# Altium schematic symbol library Connector.SchLib: 372 symbols (part 3 of 4)
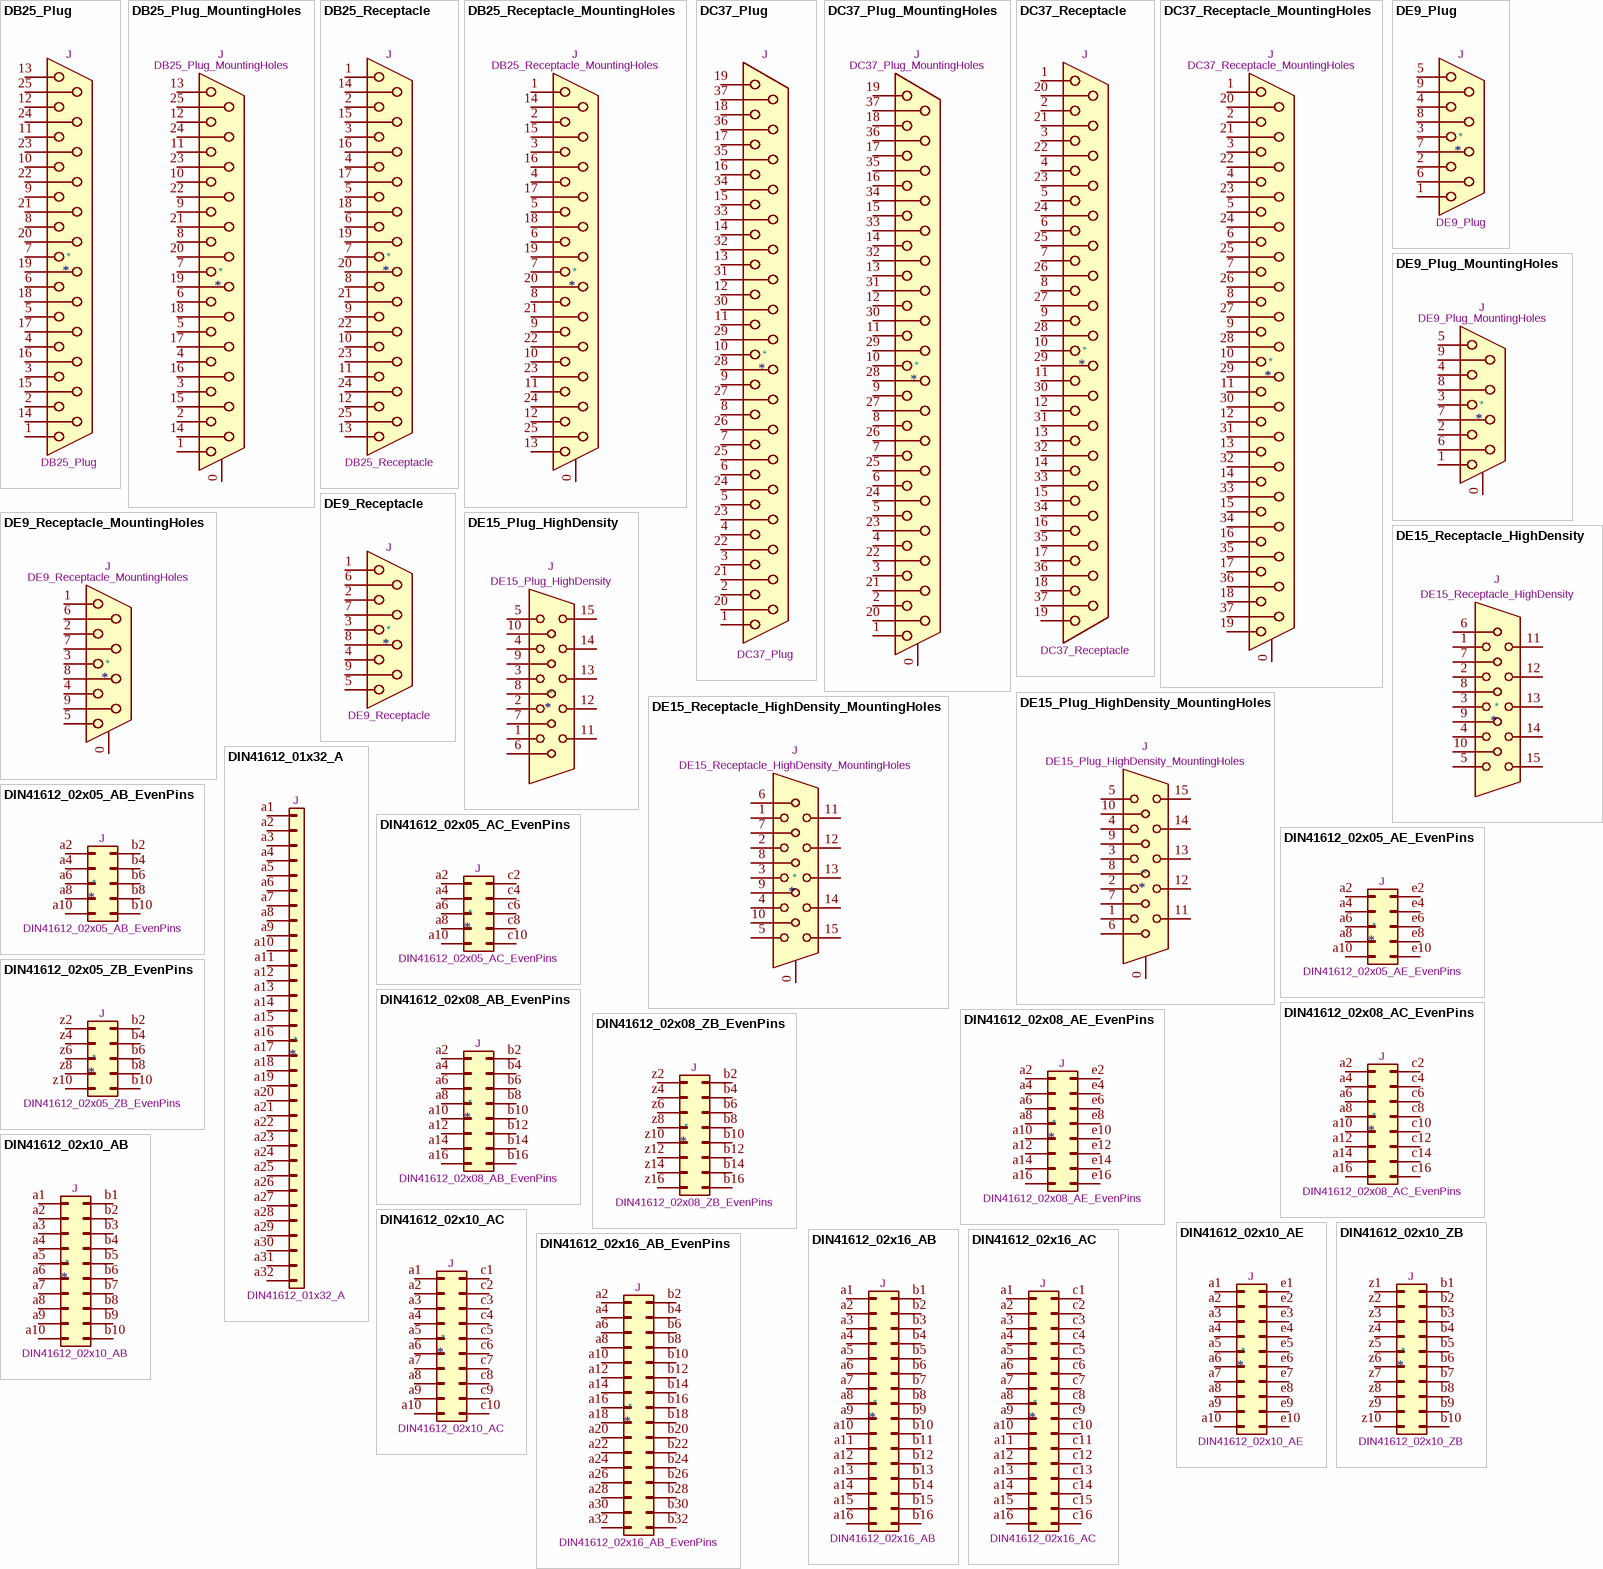
[diagram p18: symbols DB25_Plug to DIN41612_02x16_AC]

## DE15_Receptacle_HighDensity_MountingHoles
designator *  value DE15_Receptacle_HighDensity_MountingHoles  Reference: J
ki_keywords: connector receptacle de15 female D-SUB VGA; ki_description: 15-pin female receptacle socket D-SUB connector, High density (3 columns), Triple Row, Generic, VGA-connector, Mounting Hole; ki_fp_filters: DSUB*Female*; Datasheet: ~
pins: 0, 1, 2, 3, 4, 5, 6, 7, 8, 9, 10, 11, 12, 13, 14, 15

## DIN41612_01x32_A
designator *  value DIN41612_01x32_A  Reference: J
ki_keywords: connector; ki_description: DIN41612 connector, single row (A), 01x32, script generated (kicad-library-utils/schlib/autogen/connector/); ki_fp_filters: DIN41612*1x*; Datasheet: ~
pins: a1 Pin_a1, a2 Pin_a2, a3 Pin_a3, a4 Pin_a4, a5 Pin_a5, a6 Pin_a6, a7 Pin_a7, a8 Pin_a8, a9 Pin_a9, a10 Pin_a10, a11 Pin_a11, a12 Pin_a12, a13 Pin_a13, a14 Pin_a14, a15 Pin_a15, a16 Pin_a16, a17 Pin_a17, a18 Pin_a18, a19 Pin_a19, a20 Pin_a20, a21 Pin_a21, a22 Pin_a22, a23 Pin_a23, a24 Pin_a24, a25 Pin_a25, a26 Pin_a26, a27 Pin_a27, a28 Pin_a28, a29 Pin_a29, a30 Pin_a30, a31 Pin_a31, a32 Pin_a32

## DIN41612_02x05_AB_EvenPins
designator *  value DIN41612_02x05_AB_EvenPins  Reference: J
ki_keywords: connector; ki_description: DIN41612 connector, double row (AB) even pins only, 02x05, script generated (kicad-library-utils/schlib/autogen/connector/); ki_fp_filters: DIN41612*2x*; Datasheet: ~
pins: a2 Pin_a2, a4 Pin_a4, a6 Pin_a6, a8 Pin_a8, a10 Pin_a10, b2 Pin_b2, b4 Pin_b4, b6 Pin_b6, b8 Pin_b8, b10 Pin_b10

## DIN41612_02x05_AC_EvenPins
designator *  value DIN41612_02x05_AC_EvenPins  Reference: J
ki_keywords: connector; ki_description: DIN41612 connector, double row (AC) even pins only, 02x05, script generated (kicad-library-utils/schlib/autogen/connector/); ki_fp_filters: DIN41612*2x*; Datasheet: ~
pins: a2 Pin_a2, a4 Pin_a4, a6 Pin_a6, a8 Pin_a8, a10 Pin_a10, c2 Pin_c2, c4 Pin_c4, c6 Pin_c6, c8 Pin_c8, c10 Pin_c10

## DIN41612_02x05_AE_EvenPins
designator *  value DIN41612_02x05_AE_EvenPins  Reference: J
ki_keywords: connector; ki_description: DIN41612 connector, double row (AE) even pins only, 02x05, script generated (kicad-library-utils/schlib/autogen/connector/); ki_fp_filters: DIN41612*2x*; Datasheet: ~
pins: a2 Pin_a2, a4 Pin_a4, a6 Pin_a6, a8 Pin_a8, a10 Pin_a10, e2 Pin_e2, e4 Pin_e4, e6 Pin_e6, e8 Pin_e8, e10 Pin_e10

## DIN41612_02x05_ZB_EvenPins
designator *  value DIN41612_02x05_ZB_EvenPins  Reference: J
ki_keywords: connector; ki_description: DIN41612 connector, double row (ZB) even pins only, 02x05, script generated (kicad-library-utils/schlib/autogen/connector/); ki_fp_filters: DIN41612*2x*; Datasheet: ~
pins: b2 Pin_b2, b4 Pin_b4, b6 Pin_b6, b8 Pin_b8, b10 Pin_b10, z2 Pin_z2, z4 Pin_z4, z6 Pin_z6, z8 Pin_z8, z10 Pin_z10

## DIN41612_02x08_AB_EvenPins
designator *  value DIN41612_02x08_AB_EvenPins  Reference: J
ki_keywords: connector; ki_description: DIN41612 connector, double row (AB) even pins only, 02x08, script generated (kicad-library-utils/schlib/autogen/connector/); ki_fp_filters: DIN41612*2x*; Datasheet: ~
pins: a2 Pin_a2, a4 Pin_a4, a6 Pin_a6, a8 Pin_a8, a10 Pin_a10, a12 Pin_a12, a14 Pin_a14, a16 Pin_a16, b2 Pin_b2, b4 Pin_b4, b6 Pin_b6, b8 Pin_b8, b10 Pin_b10, b12 Pin_b12, b14 Pin_b14, b16 Pin_b16

## DIN41612_02x08_AC_EvenPins
designator *  value DIN41612_02x08_AC_EvenPins  Reference: J
ki_keywords: connector; ki_description: DIN41612 connector, double row (AC) even pins only, 02x08, script generated (kicad-library-utils/schlib/autogen/connector/); ki_fp_filters: DIN41612*2x*; Datasheet: ~
pins: a2 Pin_a2, a4 Pin_a4, a6 Pin_a6, a8 Pin_a8, a10 Pin_a10, a12 Pin_a12, a14 Pin_a14, a16 Pin_a16, c2 Pin_c2, c4 Pin_c4, c6 Pin_c6, c8 Pin_c8, c10 Pin_c10, c12 Pin_c12, c14 Pin_c14, c16 Pin_c16

## DIN41612_02x08_AE_EvenPins
designator *  value DIN41612_02x08_AE_EvenPins  Reference: J
ki_keywords: connector; ki_description: DIN41612 connector, double row (AE) even pins only, 02x08, script generated (kicad-library-utils/schlib/autogen/connector/); ki_fp_filters: DIN41612*2x*; Datasheet: ~
pins: a2 Pin_a2, a4 Pin_a4, a6 Pin_a6, a8 Pin_a8, a10 Pin_a10, a12 Pin_a12, a14 Pin_a14, a16 Pin_a16, e2 Pin_e2, e4 Pin_e4, e6 Pin_e6, e8 Pin_e8, e10 Pin_e10, e12 Pin_e12, e14 Pin_e14, e16 Pin_e16

## DIN41612_02x08_ZB_EvenPins
designator *  value DIN41612_02x08_ZB_EvenPins  Reference: J
ki_keywords: connector; ki_description: DIN41612 connector, double row (ZB) even pins only, 02x08, script generated (kicad-library-utils/schlib/autogen/connector/); ki_fp_filters: DIN41612*2x*; Datasheet: ~
pins: b2 Pin_b2, b4 Pin_b4, b6 Pin_b6, b8 Pin_b8, b10 Pin_b10, b12 Pin_b12, b14 Pin_b14, b16 Pin_b16, z2 Pin_z2, z4 Pin_z4, z6 Pin_z6, z8 Pin_z8, z10 Pin_z10, z12 Pin_z12, z14 Pin_z14, z16 Pin_z16

## DIN41612_02x10_AB
designator *  value DIN41612_02x10_AB  Reference: J
ki_keywords: connector; ki_description: DIN41612 connector, double row (AB), 02x10, script generated (kicad-library-utils/schlib/autogen/connector/); ki_fp_filters: DIN41612*2x*; Datasheet: ~
pins: a1 Pin_a1, a2 Pin_a2, a3 Pin_a3, a4 Pin_a4, a5 Pin_a5, a6 Pin_a6, a7 Pin_a7, a8 Pin_a8, a9 Pin_a9, a10 Pin_a10, b1 Pin_b1, b2 Pin_b2, b3 Pin_b3, b4 Pin_b4, b5 Pin_b5, b6 Pin_b6, b7 Pin_b7, b8 Pin_b8, b9 Pin_b9, b10 Pin_b10

## DIN41612_02x10_AC
designator *  value DIN41612_02x10_AC  Reference: J
ki_keywords: connector; ki_description: DIN41612 connector, double row (AC), 02x10, script generated (kicad-library-utils/schlib/autogen/connector/); ki_fp_filters: DIN41612*2x*; Datasheet: ~
pins: a1 Pin_a1, a2 Pin_a2, a3 Pin_a3, a4 Pin_a4, a5 Pin_a5, a6 Pin_a6, a7 Pin_a7, a8 Pin_a8, a9 Pin_a9, a10 Pin_a10, c1 Pin_c1, c2 Pin_c2, c3 Pin_c3, c4 Pin_c4, c5 Pin_c5, c6 Pin_c6, c7 Pin_c7, c8 Pin_c8, c9 Pin_c9, c10 Pin_c10

## DIN41612_02x10_AE
designator *  value DIN41612_02x10_AE  Reference: J
ki_keywords: connector; ki_description: DIN41612 connector, double row (AE), 02x10, script generated (kicad-library-utils/schlib/autogen/connector/); ki_fp_filters: DIN41612*2x*; Datasheet: ~
pins: a1 Pin_a1, a2 Pin_a2, a3 Pin_a3, a4 Pin_a4, a5 Pin_a5, a6 Pin_a6, a7 Pin_a7, a8 Pin_a8, a9 Pin_a9, a10 Pin_a10, e1 Pin_e1, e2 Pin_e2, e3 Pin_e3, e4 Pin_e4, e5 Pin_e5, e6 Pin_e6, e7 Pin_e7, e8 Pin_e8, e9 Pin_e9, e10 Pin_e10

## DIN41612_02x10_ZB
designator *  value DIN41612_02x10_ZB  Reference: J
ki_keywords: connector; ki_description: DIN41612 connector, double row (ZB), 02x10, script generated (kicad-library-utils/schlib/autogen/connector/); ki_fp_filters: DIN41612*2x*; Datasheet: ~
pins: b1 Pin_b1, b2 Pin_b2, b3 Pin_b3, b4 Pin_b4, b5 Pin_b5, b6 Pin_b6, b7 Pin_b7, b8 Pin_b8, b9 Pin_b9, b10 Pin_b10, z1 Pin_z1, z2 Pin_z2, z3 Pin_z3, z4 Pin_z4, z5 Pin_z5, z6 Pin_z6, z7 Pin_z7, z8 Pin_z8, z9 Pin_z9, z10 Pin_z10

## DIN41612_02x16_AB
designator *  value DIN41612_02x16_AB  Reference: J
ki_keywords: connector; ki_description: DIN41612 connector, double row (AB), 02x16, script generated (kicad-library-utils/schlib/autogen/connector/); ki_fp_filters: DIN41612*2x*; Datasheet: ~
pins: a1 Pin_a1, a2 Pin_a2, a3 Pin_a3, a4 Pin_a4, a5 Pin_a5, a6 Pin_a6, a7 Pin_a7, a8 Pin_a8, a9 Pin_a9, a10 Pin_a10, a11 Pin_a11, a12 Pin_a12, a13 Pin_a13, a14 Pin_a14, a15 Pin_a15, a16 Pin_a16, b1 Pin_b1, b2 Pin_b2, b3 Pin_b3, b4 Pin_b4, b5 Pin_b5, b6 Pin_b6, b7 Pin_b7, b8 Pin_b8, b9 Pin_b9, b10 Pin_b10, b11 Pin_b11, b12 Pin_b12, b13 Pin_b13, b14 Pin_b14, b15 Pin_b15, b16 Pin_b16

## DIN41612_02x16_AB_EvenPins
designator *  value DIN41612_02x16_AB_EvenPins  Reference: J
ki_keywords: connector; ki_description: DIN41612 connector, double row (AB) even pins only, 02x16, script generated (kicad-library-utils/schlib/autogen/connector/); ki_fp_filters: DIN41612*2x*; Datasheet: ~
pins: a2 Pin_a2, a4 Pin_a4, a6 Pin_a6, a8 Pin_a8, a10 Pin_a10, a12 Pin_a12, a14 Pin_a14, a16 Pin_a16, a18 Pin_a18, a20 Pin_a20, a22 Pin_a22, a24 Pin_a24, a26 Pin_a26, a28 Pin_a28, a30 Pin_a30, a32 Pin_a32, b2 Pin_b2, b4 Pin_b4, b6 Pin_b6, b8 Pin_b8, b10 Pin_b10, b12 Pin_b12, b14 Pin_b14, b16 Pin_b16, b18 Pin_b18, b20 Pin_b20, b22 Pin_b22, b24 Pin_b24, b26 Pin_b26, b28 Pin_b28, b30 Pin_b30, b32 Pin_b32

## DIN41612_02x16_AC
designator *  value DIN41612_02x16_AC  Reference: J
ki_keywords: connector; ki_description: DIN41612 connector, double row (AC), 02x16, script generated (kicad-library-utils/schlib/autogen/connector/); ki_fp_filters: DIN41612*2x*; Datasheet: ~
pins: a1 Pin_a1, a2 Pin_a2, a3 Pin_a3, a4 Pin_a4, a5 Pin_a5, a6 Pin_a6, a7 Pin_a7, a8 Pin_a8, a9 Pin_a9, a10 Pin_a10, a11 Pin_a11, a12 Pin_a12, a13 Pin_a13, a14 Pin_a14, a15 Pin_a15, a16 Pin_a16, c1 Pin_c1, c2 Pin_c2, c3 Pin_c3, c4 Pin_c4, c5 Pin_c5, c6 Pin_c6, c7 Pin_c7, c8 Pin_c8, c9 Pin_c9, c10 Pin_c10, c11 Pin_c11, c12 Pin_c12, c13 Pin_c13, c14 Pin_c14, c15 Pin_c15, c16 Pin_c16

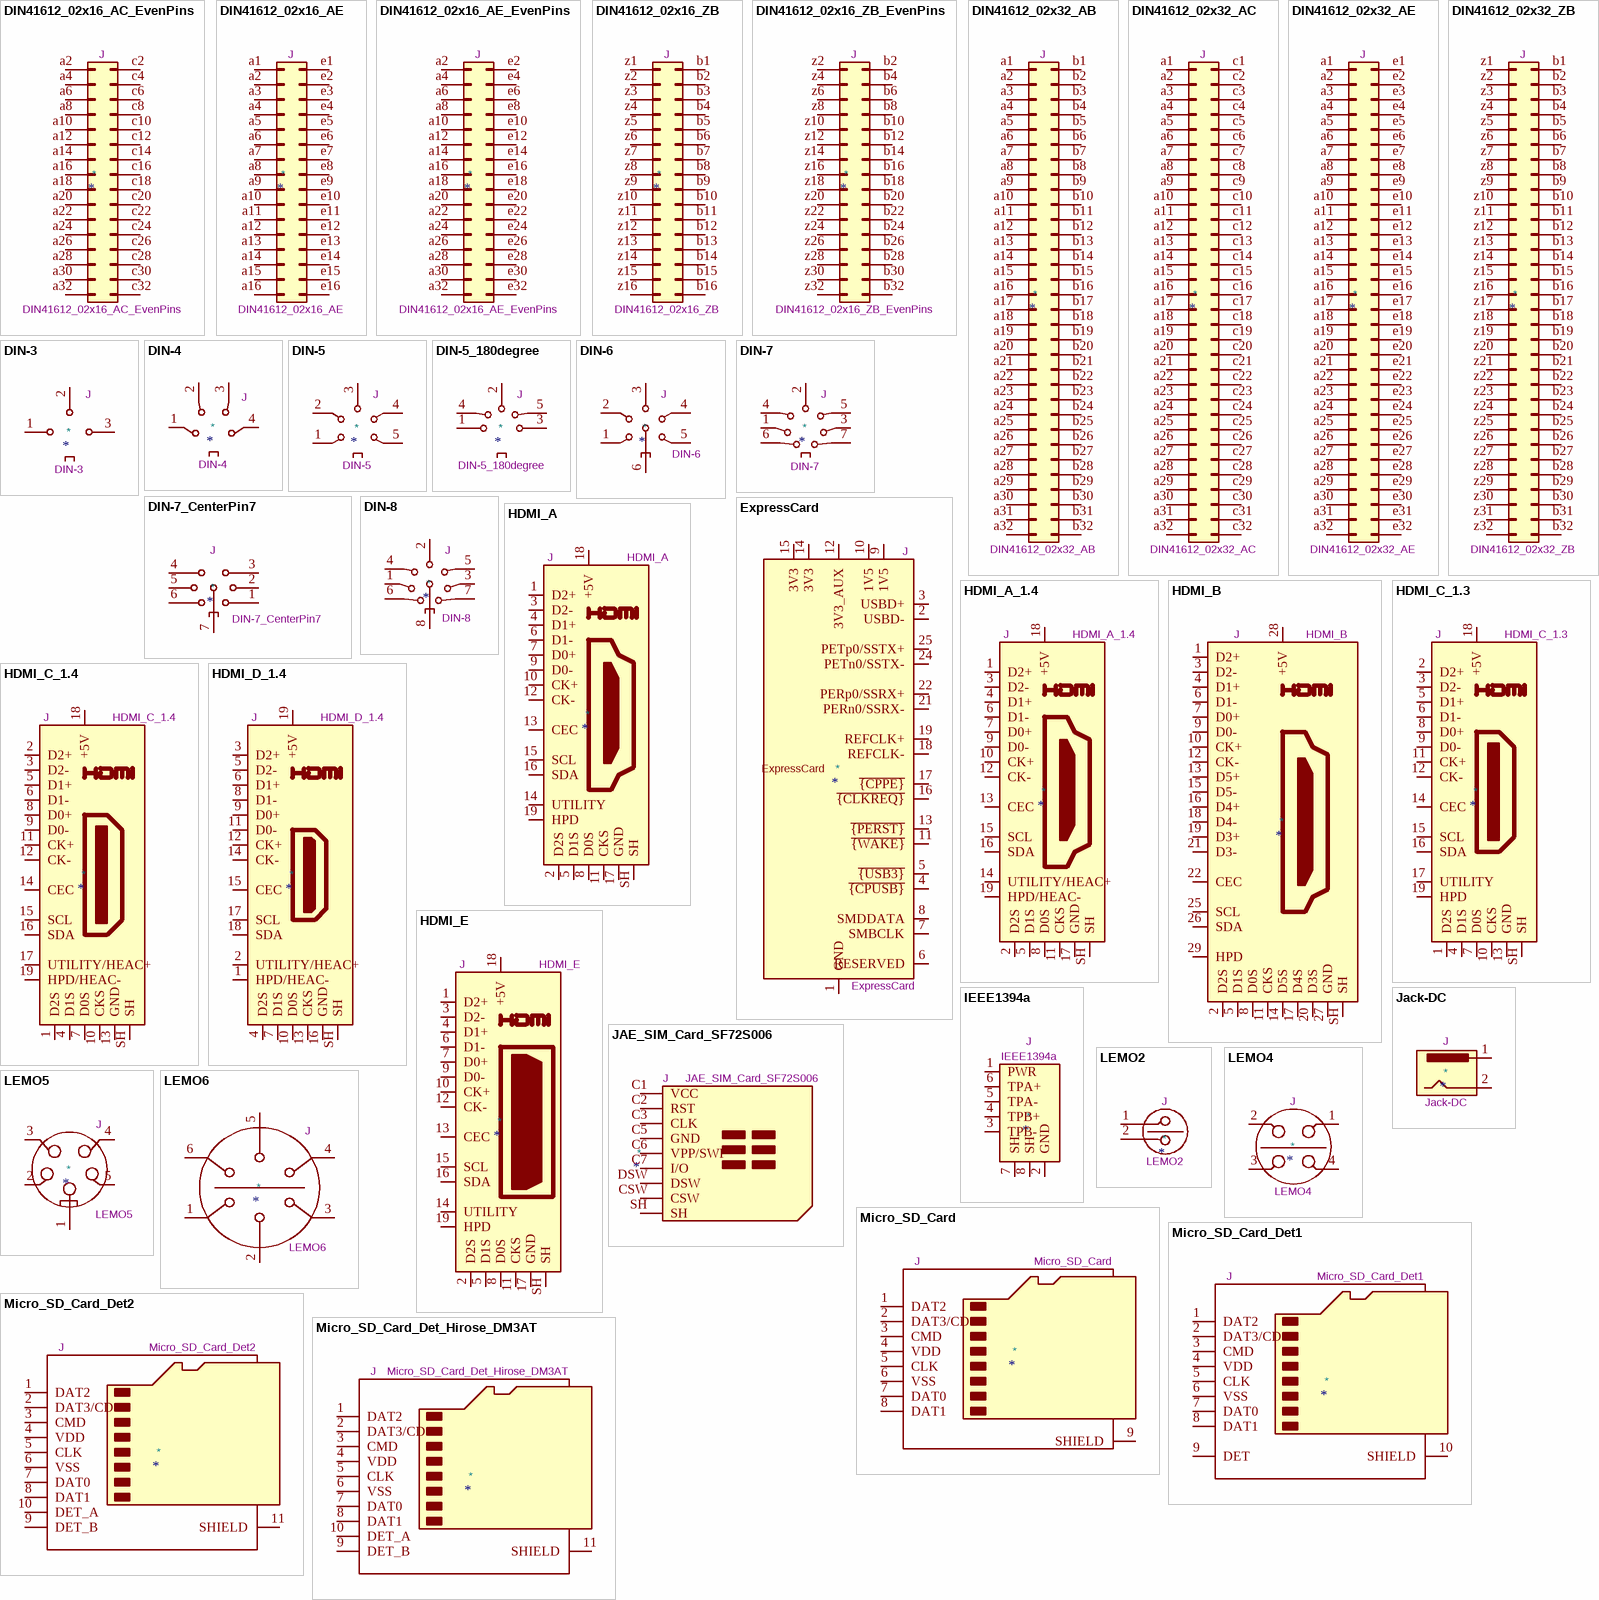
[diagram p10: symbols DIN41612_02x16_AC_EvenPins to Micro_SD_Card_Det_Hirose_DM3AT]

## DIN41612_02x16_AC_EvenPins
designator *  value DIN41612_02x16_AC_EvenPins  Reference: J
ki_keywords: connector; ki_description: DIN41612 connector, double row (AC) even pins only, 02x16, script generated (kicad-library-utils/schlib/autogen/connector/); ki_fp_filters: DIN41612*2x*; Datasheet: ~
pins: a2 Pin_a2, a4 Pin_a4, a6 Pin_a6, a8 Pin_a8, a10 Pin_a10, a12 Pin_a12, a14 Pin_a14, a16 Pin_a16, a18 Pin_a18, a20 Pin_a20, a22 Pin_a22, a24 Pin_a24, a26 Pin_a26, a28 Pin_a28, a30 Pin_a30, a32 Pin_a32, c2 Pin_c2, c4 Pin_c4, c6 Pin_c6, c8 Pin_c8, c10 Pin_c10, c12 Pin_c12, c14 Pin_c14, c16 Pin_c16, c18 Pin_c18, c20 Pin_c20, c22 Pin_c22, c24 Pin_c24, c26 Pin_c26, c28 Pin_c28, c30 Pin_c30, c32 Pin_c32

## DIN41612_02x16_AE
designator *  value DIN41612_02x16_AE  Reference: J
ki_keywords: connector; ki_description: DIN41612 connector, double row (AE), 02x16, script generated (kicad-library-utils/schlib/autogen/connector/); ki_fp_filters: DIN41612*2x*; Datasheet: ~
pins: a1 Pin_a1, a2 Pin_a2, a3 Pin_a3, a4 Pin_a4, a5 Pin_a5, a6 Pin_a6, a7 Pin_a7, a8 Pin_a8, a9 Pin_a9, a10 Pin_a10, a11 Pin_a11, a12 Pin_a12, a13 Pin_a13, a14 Pin_a14, a15 Pin_a15, a16 Pin_a16, e1 Pin_e1, e2 Pin_e2, e3 Pin_e3, e4 Pin_e4, e5 Pin_e5, e6 Pin_e6, e7 Pin_e7, e8 Pin_e8, e9 Pin_e9, e10 Pin_e10, e11 Pin_e11, e12 Pin_e12, e13 Pin_e13, e14 Pin_e14, e15 Pin_e15, e16 Pin_e16

## DIN41612_02x16_AE_EvenPins
designator *  value DIN41612_02x16_AE_EvenPins  Reference: J
ki_keywords: connector; ki_description: DIN41612 connector, double row (AE) even pins only, 02x16, script generated (kicad-library-utils/schlib/autogen/connector/); ki_fp_filters: DIN41612*2x*; Datasheet: ~
pins: a2 Pin_a2, a4 Pin_a4, a6 Pin_a6, a8 Pin_a8, a10 Pin_a10, a12 Pin_a12, a14 Pin_a14, a16 Pin_a16, a18 Pin_a18, a20 Pin_a20, a22 Pin_a22, a24 Pin_a24, a26 Pin_a26, a28 Pin_a28, a30 Pin_a30, a32 Pin_a32, e2 Pin_e2, e4 Pin_e4, e6 Pin_e6, e8 Pin_e8, e10 Pin_e10, e12 Pin_e12, e14 Pin_e14, e16 Pin_e16, e18 Pin_e18, e20 Pin_e20, e22 Pin_e22, e24 Pin_e24, e26 Pin_e26, e28 Pin_e28, e30 Pin_e30, e32 Pin_e32

## DIN41612_02x16_ZB
designator *  value DIN41612_02x16_ZB  Reference: J
ki_keywords: connector; ki_description: DIN41612 connector, double row (ZB), 02x16, script generated (kicad-library-utils/schlib/autogen/connector/); ki_fp_filters: DIN41612*2x*; Datasheet: ~
pins: b1 Pin_b1, b2 Pin_b2, b3 Pin_b3, b4 Pin_b4, b5 Pin_b5, b6 Pin_b6, b7 Pin_b7, b8 Pin_b8, b9 Pin_b9, b10 Pin_b10, b11 Pin_b11, b12 Pin_b12, b13 Pin_b13, b14 Pin_b14, b15 Pin_b15, b16 Pin_b16, z1 Pin_z1, z2 Pin_z2, z3 Pin_z3, z4 Pin_z4, z5 Pin_z5, z6 Pin_z6, z7 Pin_z7, z8 Pin_z8, z9 Pin_z9, z10 Pin_z10, z11 Pin_z11, z12 Pin_z12, z13 Pin_z13, z14 Pin_z14, z15 Pin_z15, z16 Pin_z16

## DIN41612_02x16_ZB_EvenPins
designator *  value DIN41612_02x16_ZB_EvenPins  Reference: J
ki_keywords: connector; ki_description: DIN41612 connector, double row (ZB) even pins only, 02x16, script generated (kicad-library-utils/schlib/autogen/connector/); ki_fp_filters: DIN41612*2x*; Datasheet: ~
pins: b2 Pin_b2, b4 Pin_b4, b6 Pin_b6, b8 Pin_b8, b10 Pin_b10, b12 Pin_b12, b14 Pin_b14, b16 Pin_b16, b18 Pin_b18, b20 Pin_b20, b22 Pin_b22, b24 Pin_b24, b26 Pin_b26, b28 Pin_b28, b30 Pin_b30, b32 Pin_b32, z2 Pin_z2, z4 Pin_z4, z6 Pin_z6, z8 Pin_z8, z10 Pin_z10, z12 Pin_z12, z14 Pin_z14, z16 Pin_z16, z18 Pin_z18, z20 Pin_z20, z22 Pin_z22, z24 Pin_z24, z26 Pin_z26, z28 Pin_z28, z30 Pin_z30, z32 Pin_z32

## DIN41612_02x32_AB
designator *  value DIN41612_02x32_AB  Reference: J
ki_keywords: connector; ki_description: DIN41612 connector, double row (AB), 02x32, script generated (kicad-library-utils/schlib/autogen/connector/); ki_fp_filters: DIN41612*2x*; Datasheet: ~
pins: a1 Pin_a1, a2 Pin_a2, a3 Pin_a3, a4 Pin_a4, a5 Pin_a5, a6 Pin_a6, a7 Pin_a7, a8 Pin_a8, a9 Pin_a9, a10 Pin_a10, a11 Pin_a11, a12 Pin_a12, a13 Pin_a13, a14 Pin_a14, a15 Pin_a15, a16 Pin_a16, a17 Pin_a17, a18 Pin_a18, a19 Pin_a19, a20 Pin_a20, a21 Pin_a21, a22 Pin_a22, a23 Pin_a23, a24 Pin_a24, a25 Pin_a25, a26 Pin_a26, a27 Pin_a27, a28 Pin_a28, a29 Pin_a29, a30 Pin_a30, a31 Pin_a31, a32 Pin_a32, b1 Pin_b1, b2 Pin_b2, b3 Pin_b3, b4 Pin_b4, b5 Pin_b5, b6 Pin_b6, b7 Pin_b7, b8 Pin_b8, b9 Pin_b9, b10 Pin_b10, b11 Pin_b11, b12 Pin_b12, b13 Pin_b13, b14 Pin_b14, b15 Pin_b15, b16 Pin_b16, b17 Pin_b17, b18 Pin_b18, b19 Pin_b19, b20 Pin_b20, b21 Pin_b21, b22 Pin_b22, b23 Pin_b23, b24 Pin_b24, b25 Pin_b25, b26 Pin_b26, b27 Pin_b27, b28 Pin_b28, b29 Pin_b29, b30 Pin_b30, b31 Pin_b31, b32 Pin_b32

## DIN41612_02x32_AC
designator *  value DIN41612_02x32_AC  Reference: J
ki_keywords: connector; ki_description: DIN41612 connector, double row (AC), 02x32, script generated (kicad-library-utils/schlib/autogen/connector/); ki_fp_filters: DIN41612*2x*; Datasheet: ~
pins: a1 Pin_a1, a2 Pin_a2, a3 Pin_a3, a4 Pin_a4, a5 Pin_a5, a6 Pin_a6, a7 Pin_a7, a8 Pin_a8, a9 Pin_a9, a10 Pin_a10, a11 Pin_a11, a12 Pin_a12, a13 Pin_a13, a14 Pin_a14, a15 Pin_a15, a16 Pin_a16, a17 Pin_a17, a18 Pin_a18, a19 Pin_a19, a20 Pin_a20, a21 Pin_a21, a22 Pin_a22, a23 Pin_a23, a24 Pin_a24, a25 Pin_a25, a26 Pin_a26, a27 Pin_a27, a28 Pin_a28, a29 Pin_a29, a30 Pin_a30, a31 Pin_a31, a32 Pin_a32, c1 Pin_c1, c2 Pin_c2, c3 Pin_c3, c4 Pin_c4, c5 Pin_c5, c6 Pin_c6, c7 Pin_c7, c8 Pin_c8, c9 Pin_c9, c10 Pin_c10, c11 Pin_c11, c12 Pin_c12, c13 Pin_c13, c14 Pin_c14, c15 Pin_c15, c16 Pin_c16, c17 Pin_c17, c18 Pin_c18, c19 Pin_c19, c20 Pin_c20, c21 Pin_c21, c22 Pin_c22, c23 Pin_c23, c24 Pin_c24, c25 Pin_c25, c26 Pin_c26, c27 Pin_c27, c28 Pin_c28, c29 Pin_c29, c30 Pin_c30, c31 Pin_c31, c32 Pin_c32

## DIN41612_02x32_AE
designator *  value DIN41612_02x32_AE  Reference: J
ki_keywords: connector; ki_description: DIN41612 connector, double row (AE), 02x32, script generated (kicad-library-utils/schlib/autogen/connector/); ki_fp_filters: DIN41612*2x*; Datasheet: ~
pins: a1 Pin_a1, a2 Pin_a2, a3 Pin_a3, a4 Pin_a4, a5 Pin_a5, a6 Pin_a6, a7 Pin_a7, a8 Pin_a8, a9 Pin_a9, a10 Pin_a10, a11 Pin_a11, a12 Pin_a12, a13 Pin_a13, a14 Pin_a14, a15 Pin_a15, a16 Pin_a16, a17 Pin_a17, a18 Pin_a18, a19 Pin_a19, a20 Pin_a20, a21 Pin_a21, a22 Pin_a22, a23 Pin_a23, a24 Pin_a24, a25 Pin_a25, a26 Pin_a26, a27 Pin_a27, a28 Pin_a28, a29 Pin_a29, a30 Pin_a30, a31 Pin_a31, a32 Pin_a32, e1 Pin_e1, e2 Pin_e2, e3 Pin_e3, e4 Pin_e4, e5 Pin_e5, e6 Pin_e6, e7 Pin_e7, e8 Pin_e8, e9 Pin_e9, e10 Pin_e10, e11 Pin_e11, e12 Pin_e12, e13 Pin_e13, e14 Pin_e14, e15 Pin_e15, e16 Pin_e16, e17 Pin_e17, e18 Pin_e18, e19 Pin_e19, e20 Pin_e20, e21 Pin_e21, e22 Pin_e22, e23 Pin_e23, e24 Pin_e24, e25 Pin_e25, e26 Pin_e26, e27 Pin_e27, e28 Pin_e28, e29 Pin_e29, e30 Pin_e30, e31 Pin_e31, e32 Pin_e32

## DIN41612_02x32_ZB
designator *  value DIN41612_02x32_ZB  Reference: J
ki_keywords: connector; ki_description: DIN41612 connector, double row (ZB), 02x32, script generated (kicad-library-utils/schlib/autogen/connector/); ki_fp_filters: DIN41612*2x*; Datasheet: ~
pins: b1 Pin_b1, b2 Pin_b2, b3 Pin_b3, b4 Pin_b4, b5 Pin_b5, b6 Pin_b6, b7 Pin_b7, b8 Pin_b8, b9 Pin_b9, b10 Pin_b10, b11 Pin_b11, b12 Pin_b12, b13 Pin_b13, b14 Pin_b14, b15 Pin_b15, b16 Pin_b16, b17 Pin_b17, b18 Pin_b18, b19 Pin_b19, b20 Pin_b20, b21 Pin_b21, b22 Pin_b22, b23 Pin_b23, b24 Pin_b24, b25 Pin_b25, b26 Pin_b26, b27 Pin_b27, b28 Pin_b28, b29 Pin_b29, b30 Pin_b30, b31 Pin_b31, b32 Pin_b32, z1 Pin_z1, z2 Pin_z2, z3 Pin_z3, z4 Pin_z4, z5 Pin_z5, z6 Pin_z6, z7 Pin_z7, z8 Pin_z8, z9 Pin_z9, z10 Pin_z10, z11 Pin_z11, z12 Pin_z12, z13 Pin_z13, z14 Pin_z14, z15 Pin_z15, z16 Pin_z16, z17 Pin_z17, z18 Pin_z18, z19 Pin_z19, z20 Pin_z20, z21 Pin_z21, z22 Pin_z22, z23 Pin_z23, z24 Pin_z24, z25 Pin_z25, z26 Pin_z26, z27 Pin_z27, z28 Pin_z28, z29 Pin_z29, z30 Pin_z30, z31 Pin_z31, z32 Pin_z32

## DIN-3
designator *  value DIN-3  Reference: J
ki_keywords: circular DIN connector; ki_description: 3-pin DIN connector; ki_fp_filters: DIN*; Datasheet: http://www.mouser.com/ds/2/18/40_c091_abd_e-75918.pdf
pins: 1, 2, 3

## DIN-4
designator *  value DIN-4  Reference: J
ki_keywords: circular DIN connector; ki_description: 4-pin DIN connector; ki_fp_filters: DIN*; Datasheet: http://www.mouser.com/ds/2/18/40_c091_abd_e-75918.pdf
pins: 1, 2, 3, 4

## DIN-5
designator *  value DIN-5  Reference: J
ki_keywords: circular DIN connector; ki_description: 5-pin DIN connector; ki_fp_filters: DIN*; Datasheet: http://www.mouser.com/ds/2/18/40_c091_abd_e-75918.pdf
pins: 1, 2, 3, 4, 5

## DIN-5_180degree
designator *  value DIN-5_180degree  Reference: J
ki_keywords: circular DIN connector stereo audio; ki_description: 5-pin DIN connector (5-pin DIN-5 stereo); ki_fp_filters: DIN*; Datasheet: http://www.mouser.com/ds/2/18/40_c091_abd_e-75918.pdf
pins: 1, 2, 3, 4, 5

## DIN-6
designator *  value DIN-6  Reference: J
ki_keywords: circular DIN connector; ki_description: 6-pin DIN connector; ki_fp_filters: DIN*; Datasheet: http://www.mouser.com/ds/2/18/40_c091_abd_e-75918.pdf
pins: 1, 2, 3, 4, 5, 6

## DIN-7
designator *  value DIN-7  Reference: J
ki_keywords: circular DIN connector; ki_description: 7-pin DIN connector; ki_fp_filters: DIN*; Datasheet: http://www.mouser.com/ds/2/18/40_c091_abd_e-75918.pdf
pins: 1, 2, 3, 4, 5, 6, 7

## DIN-7_CenterPin7
designator *  value DIN-7_CenterPin7  Reference: J
ki_keywords: circular DIN connector; ki_description: 7-pin DIN connector with pin 7 in center; ki_fp_filters: DIN*; Datasheet: http://www.mouser.com/ds/2/18/40_c091_abd_e-75918.pdf
pins: 1, 2, 3, 4, 5, 6, 7

## DIN-8
designator *  value DIN-8  Reference: J
ki_keywords: circular DIN connector; ki_description: 8-pin DIN connector; ki_fp_filters: DIN*; Datasheet: http://www.mouser.com/ds/2/18/40_c091_abd_e-75918.pdf
pins: 1, 2, 3, 4, 5, 6, 7, 8

## ExpressCard
designator *  value ExpressCard  Reference: J
ki_keywords: expresscard pci express; ki_description: ExpressCard connector; ki_fp_filters: ExpressCard*; Datasheet: https://web.archive.org/web/20180809060653/http://www.usb.org/developers/expresscard/EC_specifications/ExpressCard_2_0_FINAL.pdf
pins: 1 GND, 2 USBD-, 3 USBD+, 4 ~{{CPUSB}}, 5 ~{{USB3}}, 6 RESERVED, 7 SMBCLK, 8 SMDDATA, 9 1V5, 10 1V5, 11 ~{{WAKE}}, 12 3V3_AUX, 13 ~{{PERST}}, 14 3V3, 15 3V3, 16 ~{{CLKREQ}}, 17 ~{{CPPE}}, 18 REFCLK-, 19 REFCLK+, 20 GND hidden, 21 PERn0/SSRX-, 22 PERp0/SSRX+, 23 GND hidden, 24 PETn0/SSTX-, 25 PETp0/SSTX+, 26 GND hidden

## HDMI_A
designator *  value HDMI_A  Reference: J
ki_keywords: hdmi conn; ki_description: HDMI type A connector; ki_fp_filters: HDMI*A*; Datasheet: https://en.wikipedia.org/wiki/HDMI
pins: 1 D2+, 2 D2S, 3 D2-, 4 D1+, 5 D1S, 6 D1-, 7 D0+, 8 D0S, 9 D0-, 10 CK+, 11 CKS, 12 CK-, 13 CEC, 14 UTILITY, 15 SCL, 16 SDA, 17 GND, 18 +5V, 19 HPD, SH

## HDMI_A_1.4
designator *  value HDMI_A_1.4  Reference: J
ki_keywords: hdmi conn; ki_description: HDMI 1.4+ type A connector; ki_fp_filters: HDMI*A*; Datasheet: https://en.wikipedia.org/wiki/HDMI
pins: 1 D2+, 2 D2S, 3 D2-, 4 D1+, 5 D1S, 6 D1-, 7 D0+, 8 D0S, 9 D0-, 10 CK+, 11 CKS, 12 CK-, 13 CEC, 14 UTILITY/HEAC+, 15 SCL, 16 SDA, 17 GND, 18 +5V, 19 HPD/HEAC-, SH

## HDMI_B
designator *  value HDMI_B  Reference: J
ki_keywords: hdmi conn; ki_description: HDMI type B connector; ki_fp_filters: HDMI*B*; Datasheet: http://pinouts.ru/Video/hdmi_pinout.shtml
pins: 1 D2+, 2 D2S, 3 D2-, 4 D1+, 5 D1S, 6 D1-, 7 D0+, 8 D0S, 9 D0-, 10 CK+, 11 CKS, 12 CK-, 13 D5+, 14 D5S, 15 D5-, 16 D4+, 17 D4S, 18 D4-, 19 D3+, 20 D3S, 21 D3-, 22 CEC, 23 NC hidden, 24 NC hidden, 25 SCL, 26 SDA, 27 GND, 28 +5V, 29 HPD, SH

## HDMI_C_1.3
designator *  value HDMI_C_1.3  Reference: J
ki_keywords: hdmi conn; ki_description: HDMI 1.3+ type C connector; ki_fp_filters: HDMI*C*; Datasheet: http://pinoutguide.com/PortableDevices/mini_hdmi_pinout.shtml
pins: 1 D2S, 2 D2+, 3 D2-, 4 D1S, 5 D1+, 6 D1-, 7 D0S, 8 D0+, 9 D0-, 10 CKS, 11 CK+, 12 CK-, 13 GND, 14 CEC, 15 SCL, 16 SDA, 17 UTILITY, 18 +5V, 19 HPD, SH

## HDMI_C_1.4
designator *  value HDMI_C_1.4  Reference: J
ki_keywords: hdmi conn; ki_description: HDMI 1.4+ type C connector; ki_fp_filters: HDMI*C*; Datasheet: http://pinoutguide.com/PortableDevices/mini_hdmi_pinout.shtml
pins: 1 D2S, 2 D2+, 3 D2-, 4 D1S, 5 D1+, 6 D1-, 7 D0S, 8 D0+, 9 D0-, 10 CKS, 11 CK+, 12 CK-, 13 GND, 14 CEC, 15 SCL, 16 SDA, 17 UTILITY/HEAC+, 18 +5V, 19 HPD/HEAC-, SH

## HDMI_D_1.4
designator *  value HDMI_D_1.4  Reference: J
ki_keywords: hdmi conn; ki_description: HDMI 1.4+ type D connector; ki_fp_filters: HDMI*D*; Datasheet: http://pinoutguide.com/PortableDevices/micro_hdmi_type_d_pinout.shtml
pins: 1 HPD/HEAC-, 2 UTILITY/HEAC+, 3 D2+, 4 D2S, 5 D2-, 6 D1+, 7 D1S, 8 D1-, 9 D0+, 10 D0S, 11 D0-, 12 CK+, 13 CKS, 14 CK-, 15 CEC, 16 GND, 17 SCL, 18 SDA, 19 +5V, SH

## HDMI_E
designator *  value HDMI_E  Reference: J
ki_keywords: hdmi conn; ki_description: HDMI type E connector; ki_fp_filters: HDMI*E*; Datasheet: https://www.hdmi.org/manufacturer/specification.aspx
pins: 1 D2+, 2 D2S, 3 D2-, 4 D1+, 5 D1S, 6 D1-, 7 D0+, 8 D0S, 9 D0-, 10 CK+, 11 CKS, 12 CK-, 13 CEC, 14 UTILITY, 15 SCL, 16 SDA, 17 GND, 18 +5V, 19 HPD, SH

## IEEE1394a
designator *  value IEEE1394a  Reference: J
ki_keywords: connector IEEE1394a FireWire; ki_description: FireWire/IEEE1394a 6-pin connector; Datasheet: ~
pins: 1 PWR, 2 GND, 3 TPB-, 4 TPB+, 5 TPA-, 6 TPA+, 7 SH, 8 SH

## Jack-DC
designator *  value Jack-DC  Reference: J
ki_keywords: DC power barrel jack connector; ki_description: DC Barrel Jack; ki_fp_filters: BarrelJack*; Datasheet: ~
pins: 1, 2

## JAE_SIM_Card_SF72S006
designator *  value JAE_SIM_Card_SF72S006  Reference: J
ki_keywords: SIM card UICC 4FF; ki_description: Nano-SIM Card (4FF) connector with Detect Switch; ki_fp_filters: JAE*SIM*Card*SF72S006*; Footprint: Connector_JAE:JAE_SIM_Card_SF72S006; Datasheet: https://www.jae.com/direct/topics/topics_file_download/topics_id=68892&ext_no=06&index=0&_lang=en&v=202003111511468456809
pins: C1 VCC, C2 RST, C3 CLK, C5 GND, C6 VPP/SWP, C7 I/O, CSW, DSW, SH

## LEMO2
designator *  value LEMO2  Reference: J
ki_keywords: LEMO connector; ki_description: 2-pin LEMO connector; Datasheet: ~
pins: 1, 2

## LEMO4
designator *  value LEMO4  Reference: J
ki_keywords: LEMO connector; ki_description: 4-pin LEMO connector; Datasheet: ~
pins: 1, 2, 3, 4

## LEMO5
designator *  value LEMO5  Reference: J
ki_keywords: LEMO connector; ki_description: 5-pin LEMO connector; Datasheet: ~
pins: 1, 2, 3, 4, 5

## LEMO6
designator *  value LEMO6  Reference: J
ki_keywords: LEMO connector; ki_description: 6-pin LEMO connector; Datasheet: ~
pins: 1, 2, 3, 4, 5, 6

## Micro_SD_Card
designator *  value Micro_SD_Card  Reference: J
ki_keywords: connector SD microsd; ki_description: Micro SD Card Socket; ki_fp_filters: microSD*; Datasheet: http://katalog.we-online.de/em/datasheet/693072010801.pdf
pins: 1 DAT2, 2 DAT3/CD, 3 CMD, 4 VDD, 5 CLK, 6 VSS, 7 DAT0, 8 DAT1, 9 SHIELD

## Micro_SD_Card_Det1
designator *  value Micro_SD_Card_Det1  Reference: J
ki_keywords: connector SD microsd; ki_description: Micro SD Card Socket with one card detection pin; ki_fp_filters: microSD*; Datasheet: https://datasheet.lcsc.com/lcsc/2110151630_XKB-Connectivity-XKTF-015-N_C381082.pdf
pins: 1 DAT2, 2 DAT3/CD, 3 CMD, 4 VDD, 5 CLK, 6 VSS, 7 DAT0, 8 DAT1, 9 DET, 10 SHIELD

## Micro_SD_Card_Det2
designator *  value Micro_SD_Card_Det2  Reference: J
ki_keywords: connector SD microsd; ki_description: Micro SD Card Socket with two card detection pins; ki_fp_filters: microSD*; Datasheet: https://www.hirose.com/en/product/document?clcode=&productname=&series=DM3&documenttype=Catalog&lang=en&documentid=D49662_en
pins: 1 DAT2, 2 DAT3/CD, 3 CMD, 4 VDD, 5 CLK, 6 VSS, 7 DAT0, 8 DAT1, 9 DET_B, 10 DET_A, 11 SHIELD

## Micro_SD_Card_Det_Hirose_DM3AT
designator *  value Micro_SD_Card_Det_Hirose_DM3AT  Reference: J
ki_keywords: connector SD microsd; ki_description: Micro SD Card Socket with card detection pins; ki_fp_filters: microSD*; Datasheet: https://www.hirose.com/product/en/download_file/key_name/DM3/category/Catalog/doc_file_id/49662/?file_category_id=4&item_id=195&is_series=1
pins: 1 DAT2, 2 DAT3/CD, 3 CMD, 4 VDD, 5 CLK, 6 VSS, 7 DAT0, 8 DAT1, 9 DET_B, 10 DET_A, 11 SHIELD

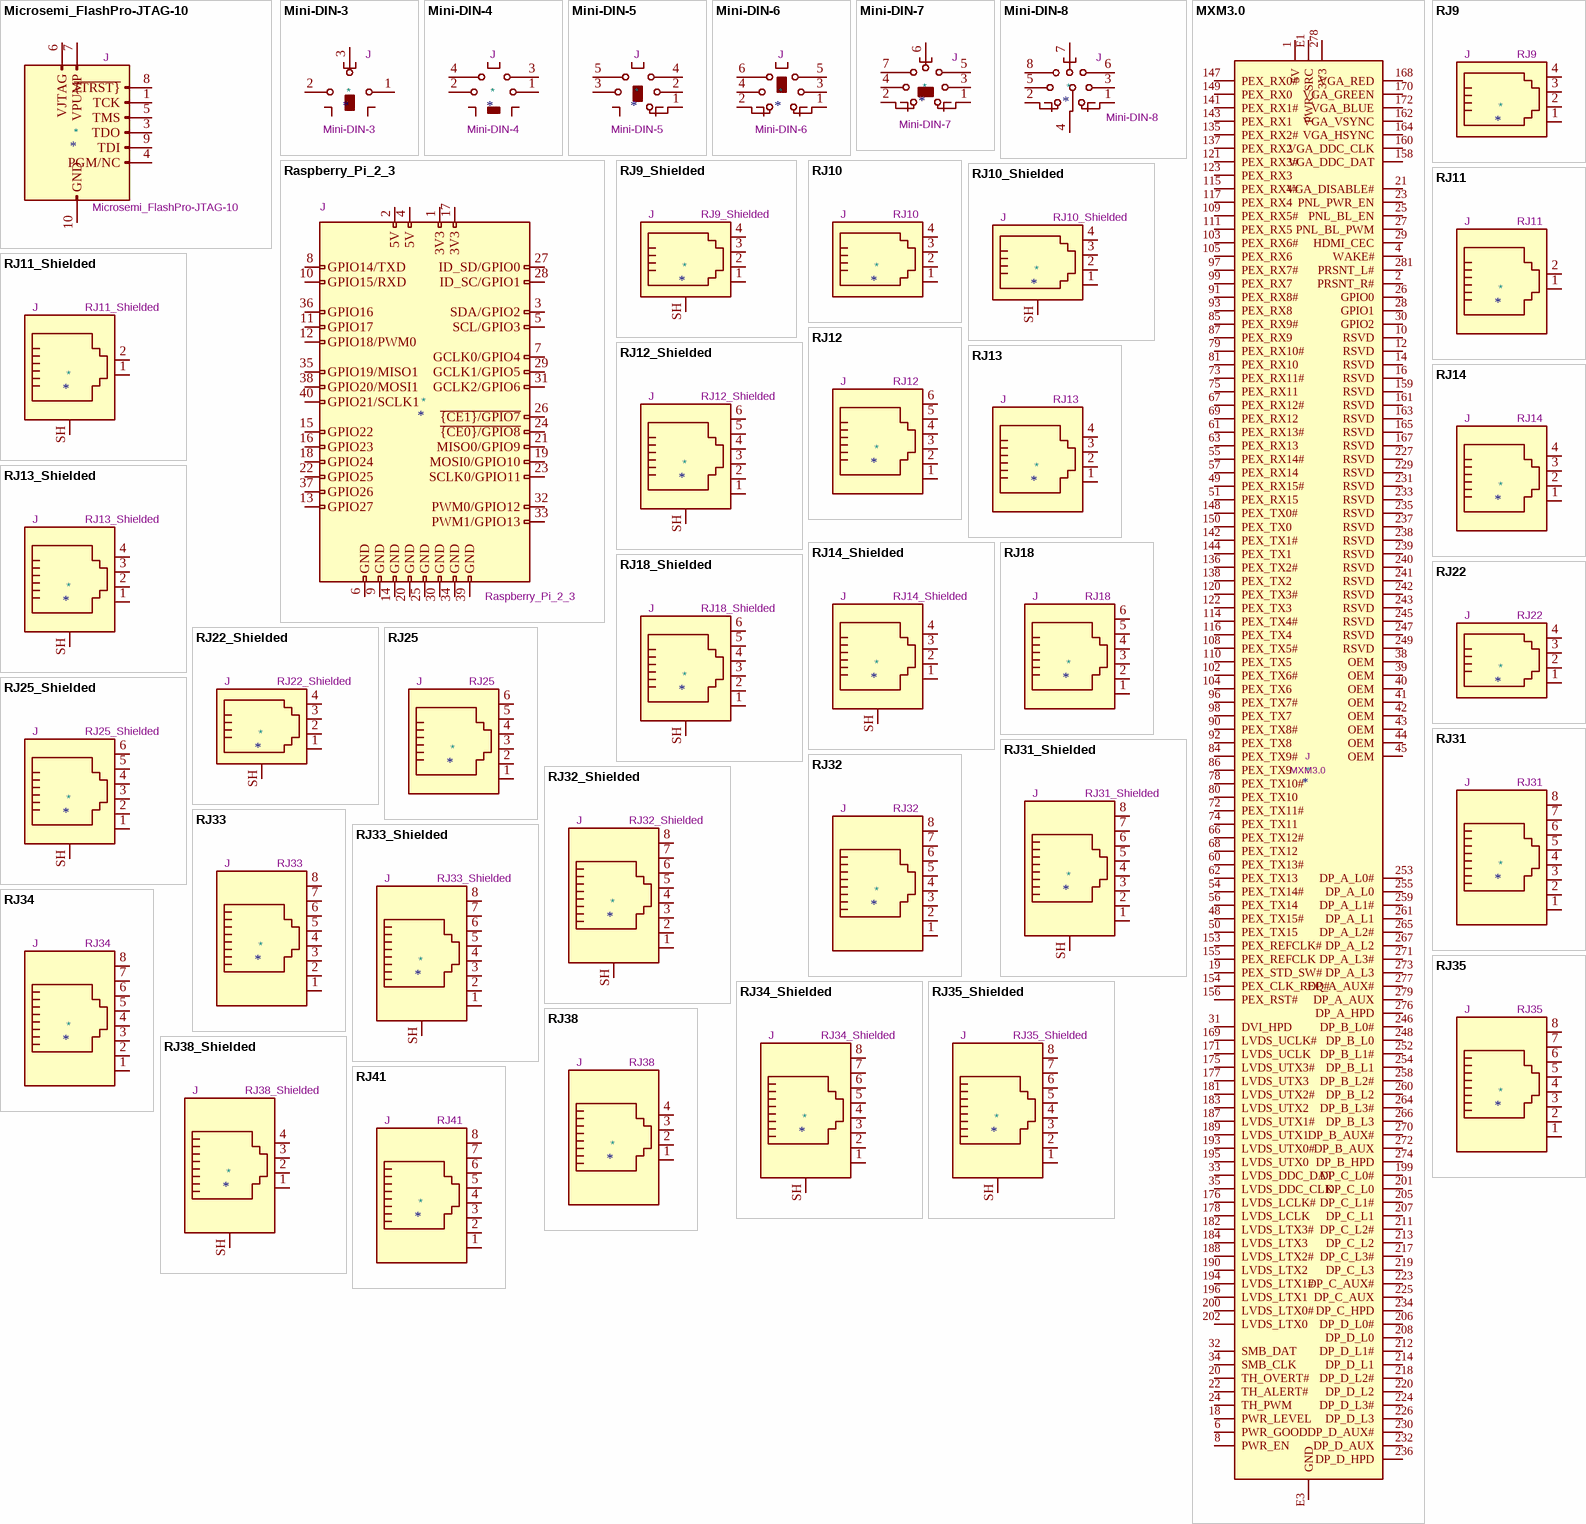
[diagram p11: symbols Microsemi_FlashPro-JTAG-10 to RJ41]

## Microsemi_FlashPro-JTAG-10
designator *  value Microsemi_FlashPro-JTAG-10  Reference: J
ki_keywords: JTAG IDC10 Pinheader Pins Connector; ki_description: ACTEL FLASH PRO 3/4, JTAG, IDC10 Pinheader Connector; ki_fp_filters: IDC?Header*2x05* Pin?Header*2x05*; Datasheet: https://www.microsemi.com/document-portal/doc_view/129973-lpf-ac386-an
pins: 1 TCK, 2 GND hidden, 3 TDO, 4 PGM/NC, 5 TMS, 6 VJTAG, 7 VPUMP, 8 ~{{TRST}}, 9 TDI, 10 GND

## Mini-DIN-3
designator *  value Mini-DIN-3  Reference: J
ki_keywords: Mini-DIN; ki_description: 3-pin Mini-DIN connector; ki_fp_filters: MINI?DIN*; Datasheet: http://www.assmann-wsw.com/fileadmin/catalogue/10_MiniDIN_rev4-0.pdf
pins: 1, 2, 3

## Mini-DIN-4
designator *  value Mini-DIN-4  Reference: J
ki_keywords: Mini-DIN; ki_description: 4-pin Mini-DIN connector; ki_fp_filters: MINI?DIN*; Datasheet: http://service.powerdynamics.com/ec/Catalog17/Section%2011.pdf
pins: 1, 2, 3, 4

## Mini-DIN-5
designator *  value Mini-DIN-5  Reference: J
ki_keywords: Mini-DIN; ki_description: 5-pin Mini-DIN connector; ki_fp_filters: MINI?DIN*; Datasheet: http://service.powerdynamics.com/ec/Catalog17/Section%2011.pdf
pins: 1, 2, 3, 4, 5
